# Altium footprint library PCB贴片元件封装库.pcblib: 366 footprints (part 1 of 23)
Each footprint in its own frame and in the unit in brackets; x right, y up, seen from the top. Pads: shape width x height; smd on the part's side, far side on the other; paste and mask are expansions set on the pad; w line width, h text height; cw(c..) or ccw(c..) is an arc to the next point about the centre after c.
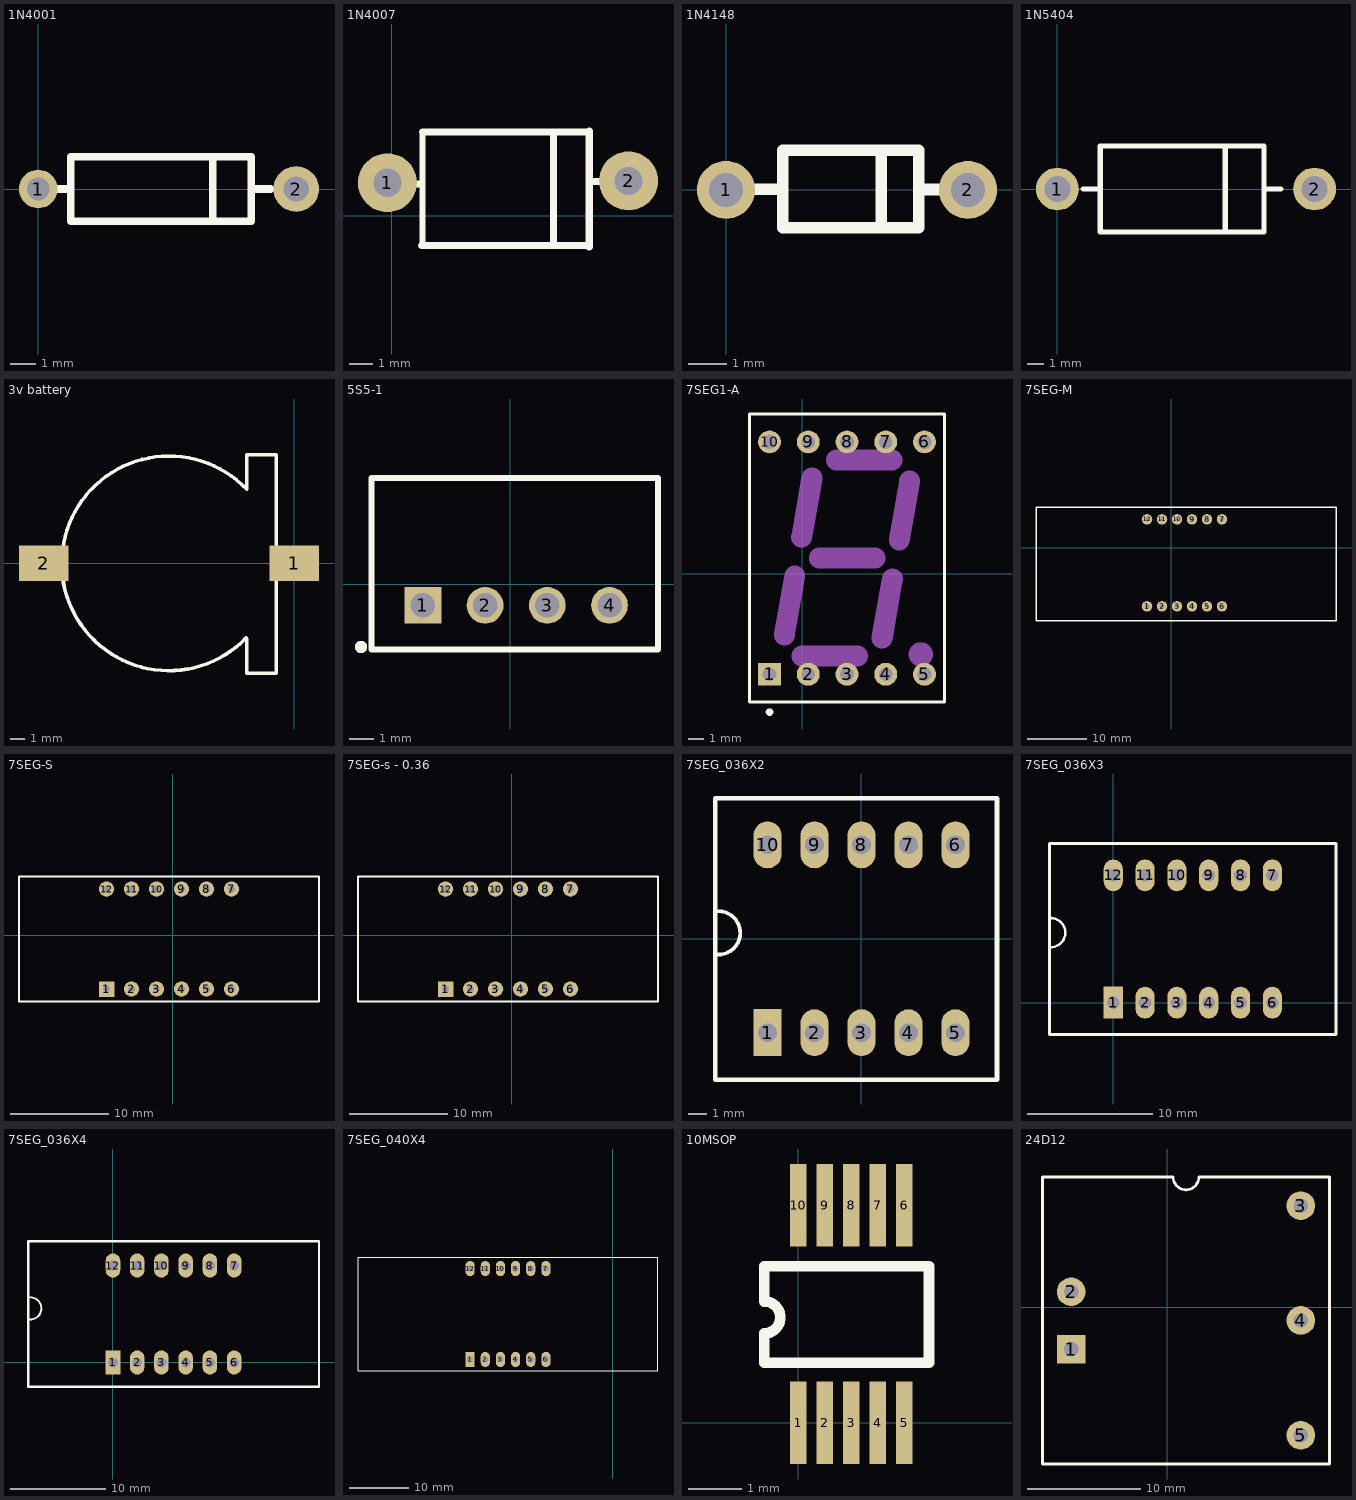
[diagram p0: the footprints below, top view; thin cyan lines are the x and y axes]

## 1N4001 [mil]
pads (2):
  round 60 hole 35: 1(0,0)
  round 70.87 hole 39.37: 2(400,0)
TopOverlay:
  lines w11.81: 50.31,50 330.31,50 ; 220,-50 330.31,-50
  lines w12: 20.32,0 50.31,0 ; 270.47,-50 270.47,50 ; 310.31,-50 50.31,-50 50.31,50 310.31,50 ; 330.31,-50 330.31,50 ; 330.31,0 360.31,0

## 1N4007 [mm]
pads (2):
  round 2.5 hole 1.2: 1(-0.178,1.397) 2(10.058,1.473)
TopOverlay:
  lines w0.254: 1.306,-1.242 1.306,3.556
  lines w0.3: 5.588,-1.27 8.39,-1.27
  lines w0.305: 0.508,1.346 1.27,1.346 ; 1.278,-1.27 7.882,-1.27 ; 1.306,3.556 8.39,3.556 ; 6.87,-1.27 6.87,3.556 ; 8.39,-1.321 8.39,3.581 ; 8.407,1.448 9.169,1.448

## 1N4148 [mil]
pads (2):
  round 60 hole 35: 1(0,0) 2(250,0)
TopOverlay:
  lines w11.81: 160.51,-39.12 160.51,40.88 ; 58.76,-39.12 58.76,40.88 199.16,40.88 199.16,-39.12 58.76,-39.12
  lines w12: 28.76,0.74 58.76,0.74 ; 202.62,0.38 232.62,0.38

## 1N5404 [mil]
pads (2):
  round 100 hole 60: 1(0,0) 2(600,0)
TopOverlay:
  lines w11.81: 100,-100 481.89,-100 ; 100,100 481.89,100
  lines w12: 60,0 100,0 ; 100,-100 100,100 ; 391.73,-100 391.73,100 ; 481.89,-100 481.89,100 ; 481.89,0 521.89,0

## 3v battery [mm]
height 1.1
pads (2):
  rect 3.5x2.5 smd: 1(0,0) 2(-17.78,0)
TopOverlay:
  lines w0.254: -3.423,-5.296 cw(c-8.89,0) -3.384,5.256 -3.384,7.702 -1.27,7.702 -1.27,-7.792 -3.384,-7.792 -3.384,-5.335 -3.423,-5.296

## 5S5-1 [mm]
pads (4):
  rect 1.5x1.5 hole 1: 1(-3.561,-0.867)
  round 1.5 hole 1: 2(-1.021,-0.867) 3(1.519,-0.867) 4(4.059,-0.867)
TopOverlay:
  circle w0.25: c-6.086,-2.567 r0.125
  lines w0.254: -5.661,-2.667 6.039,-2.667 6.039,4.333 -5.661,4.333 -5.661,-2.667

## 7SEG1-A [mm]
pads (10):
  rect 1.5x1.5 hole 0.9: 1(-2.159,-6.604)
  round 1.5 hole 0.9: 2(0.381,-6.604) 3(2.921,-6.604) 4(5.461,-6.604) 5(8.001,-6.604) 6(8.001,8.636) 7(5.461,8.636) 8(2.921,8.636) 9(0.381,8.636) 10(-2.159,8.636)
TopOverlay:
  circle w0.25: c-2.159,-9.084 r0.125
  lines w0.2: -3.479,-8.434 9.321,-8.434 9.321,10.466 -3.479,10.466 -3.479,-8.434
Mechanical1:
  circle w1: c7.763,-5.3 r0.296
  lines w1.37: -1.187,-4.038 -0.504,-0.154 ; -0.053,2.384 0.628,6.271 ; -0.037,-5.413 3.613,-5.41 ; 1.1,1.016 4.749,1.016 ; 2.232,7.441 5.881,7.441 ; 5.216,-4.24 5.901,-0.355 ; 6.348,2.185 7.031,6.074

## 7SEG-M [mil]
pads (12):
  round 70 hole 31: 1(-160,-390) 2(-60,-390) 3(40,-390) 4(140,-390) 5(240,-390) 6(340,-390) 7(340,190) 8(240,190) 9(140,190) 10(40,190) 11(-60,190) 12(-160,190)
TopOverlay:
  lines w10: -900,-485 1100,-485 1100,270 -900,270 -900,-485

## 7SEG-S [mil]
pads (12):
  rect 62x62 hole 28: 1(-265,-215)
  round 62 hole 28: 2(-165,-215) 3(-65,-215) 4(35,-215) 5(135,-215) 6(235,-215) 7(235,185) 8(135,185) 9(35,185) 10(-65,185) 11(-165,185) 12(-265,185)
TopOverlay:
  lines w8: -615,-265 585,-265 585,235 -615,235 -615,-265

## 7SEG-s - 0.36 [mil]
pads (12):
  rect 62x62 hole 28: 1(-265,-215)
  round 62 hole 28: 2(-165,-215) 3(-65,-215) 4(35,-215) 5(135,-215) 6(235,-215) 7(235,185) 8(135,185) 9(35,185) 10(-65,185) 11(-165,185) 12(-265,185)
TopOverlay:
  lines w8: -615,-265 -615,235 585,235 585,-265 -615,-265

## 7SEG_036X2 [mil]
pads (10):
  rect 60x100 hole 40: 1(-200,-200)
  oval 60x100 hole 40: 2(-100,-200) 3(0,-200) 4(100,-200) 5(200,-200) 6(200,200) 7(100,200) 8(0,200) 9(-100,200) 10(-200,200)
TopOverlay:
  lines w8: -306.5,-33.5 ccw(c-304.2,12.49) -304.2,58.53
  lines w10: -311.5,-300.5 288.5,-300.5 288.5,299.5 -311.5,299.5 -311.5,-300.5

## 7SEG_036X3 [mil]
pads (12):
  rect 60x100 hole 40: 1(0,0)
  oval 60x100 hole 40: 2(100,0) 3(200,0) 4(300,0) 5(400,0) 6(500,0) 7(500,400) 8(400,400) 9(300,400) 10(200,400) 11(100,400) 12(0,400)
TopOverlay:
  lines w8: -199,174 ccw(c-196.7,219.99) -196.7,266.03
  lines w10: -200,-100 700,-100 700,500 -200,500 -200,-100

## 7SEG_036X4 [mil]
pads (12):
  rect 60x100 hole 40: 1(0,0)
  oval 60x100 hole 40: 2(100,0) 3(200,0) 4(300,0) 5(400,0) 6(500,0) 7(500,400) 8(400,400) 9(300,400) 10(200,400) 11(100,400) 12(0,400)
TopOverlay:
  lines w8: -344,177 ccw(c-341.7,222.99) -341.7,269.03
  lines w10: -350,-100 -350,500 850,500 850,-100 -350,-100

## 7SEG_040X4 [mil]
pads (12):
  rect 60x100 hole 40: 1(-941,9158)
  oval 60x100 hole 40: 2(-841,9158) 3(-741,9158) 4(-641,9158) 5(-541,9158) 6(-441,9158) 7(-441,9758) 8(-541,9758) 9(-641,9758) 10(-741,9758) 11(-841,9758) 12(-941,9758)
TopOverlay:
  lines w8: -1681.16,9082.02 299.16,9082.02 299.16,9833.98 -1681.16,9833.98 -1681.16,9082.02

## 10MSOP [mm]
pads (10):
  rect 0.31x1.55 smd: 1(0,0) 2(0.5,0) 3(1,0) 4(1.5,0) 5(2,0) 6(2,4.1) 7(1.5,4.1) 8(1,4.1) 9(0.5,4.1) 10(0,4.1)
TopOverlay:
  lines w0.2: 2.465,1.135 -0.635,1.135 -0.635,1.686 ccw(c-0.635,1.986) -0.635,2.286 -0.635,2.95 2.465,2.95 2.465,1.15

## 24D12 [mil]
pads (5):
  rect 100x100 hole 50: 1(-334.96,-146.14)
  round 100 hole 50: 2(-334.96,53.86) 3(465.04,353.86) 4(465.04,-46.14) 5(465.04,-446.14)
TopOverlay:
  lines w10: -434.96,-546.14 -434.96,453.86 20.04,453.86 ccw(c65.04,453.86) 110.04,453.86 565.04,453.86 565.04,-546.14 -434.96,-546.14